# Altium footprint library LION.PcbLib: 90 footprints (part 10 of 13) (continued)
## PL104-4R24-1 [mil] "PL104-4R24-1"
pads (8):
  rect 59.06x59.06 hole 35.43: 1(300,100)
  round 59.06 hole 35.43: 2(300,0) 3(200,100) 4(200,0) 5(100,100) 6(100,0) 7(0,100) 8(0,0)
Top Overlay:
  lines w7.87: 486.22,148.03 530.32,103.94 ; 536.22,-34.25 ccw(c536.46,-16.73) 536.22,0.79 ; 536.22,10.24 ccw(c536.47,27.76) 536.22,45.28 ; 536.22,54.72 ccw(c536.47,72.24) 536.22,89.76 ; 536.22,101.58 ccw(c536.47,119.1) 536.22,136.62 ; -39.37,-50 360.63,-50 532.28,-50 532.28,150 360.63,150 -39.37,150 -39.37,-50
  text "PL104-4R24" at 493.55,69.69 h59.06
  text ".Designator" at -60,75 h25
Mechanical 5:
  lines w7.87: 486.22,148.03 530.32,103.94 ; 536.22,-34.25 ccw(c536.46,-16.73) 536.22,0.79 ; 536.22,10.24 ccw(c536.47,27.76) 536.22,45.28 ; 536.22,54.72 ccw(c536.47,72.24) 536.22,89.76 ; 536.22,101.58 ccw(c536.47,119.1) 536.22,136.62 ; -39.37,-50 -39.37,150 360.63,150 532.28,150 532.28,-50 360.63,-50 -39.37,-50
  text "D6" at -59.99,75 h25
  text "PL104-4R24" at 493.55,69.69 h59.06
Mechanical 14:
  text "8" at 7.2,0 h17.99
  text "2" at 307.2,0 h17.99
  text "4" at 207.2,0 h17.99
  text "6" at 107.2,0 h17.99
  text "1" at 307.2,100 h17.99
  text "3" at 207.2,100 h17.99
  text "5" at 107.2,100 h17.99
  text "7" at 7.2,100 h17.99
Mechanical 16:
  region: -43.31,-53.94 557.93,-53.94 557.93,153.94 -43.31,153.94
Mechanical 17:
  text "PL104-4R24" at 63,-7.87 h15.75
  text "RichardLC" at 56.7,-7.87 h15.75
  text "pn" at 12.6,-7.87 h15.75
3D body: height 150, standoff 0, extent -43.31,-53.94 557.93,153.94

## QFN10P_20_118X118_TP94X65V5 [mil] "QFN10P_20_118X118_TP94X65V5"
pads (16):
  oval 11x39 smd: 1(-39.37,-59.06) 2(-19.69,-59.06) 3(0,-59.06) 4(19.69,-59.06) 5(39.37,-59.06) 6(39.37,59.06) 7(19.69,59.06) 8(0,59.06) 9(-19.69,59.06) 10(-39.37,59.06)
  oct 1x1 smd: 11(0,0)
  round 22 hole 12: 12(-29.53,-19.69) 13(29.53,-19.69) 14(-29.53,19.69) 15(29.53,19.69) 16(0,0)
Top Layer:
  region: 29.53,-78.56 33.87,-78.56 33.87,-39.56 29.53,-39.56
  region: 25.19,-78.56 29.53,-78.56 29.53,-39.56 25.19,-39.56
  region: 9.85,-78.56 14.19,-78.56 14.19,-39.56 9.85,-39.56
  region: 5.5,-78.56 9.84,-78.56 9.84,-39.56 5.5,-39.56
  region: -9.84,-78.56 -5.5,-78.56 -5.5,-39.56 -9.84,-39.56
  region: -14.19,-78.56 -9.85,-78.56 -9.85,-39.56 -14.19,-39.56
  region: -29.53,-78.56 -25.19,-78.56 -25.19,-39.56 -29.53,-39.56
  region: -33.87,-78.56 -29.53,-78.56 -29.53,-39.56 -33.87,-39.56
Top Overlay:
  lines w10: -83,-23 -83,23 -64.06,23 -64.06,64.06 -52.87,64.06 -52.87,86.56 52.87,86.56 52.87,64.06 64.06,64.06 64.06,23 83,23 83,-23 64.06,-23 64.06,-64.06 52.87,-64.06 52.87,-86.56 -52.87,-86.56 -52.87,-64.06 -64.06,-64.06 -64.06,-23 -83,-23 ; -59.37,-111.56 -39.37,-91.56 -19.37,-111.56 -59.37,-111.56
Mechanical 5:
  lines w10: -83,-23 -64.06,-23 -64.06,-64.06 -52.87,-64.06 -52.87,-86.56 52.87,-86.56 52.87,-64.06 64.06,-64.06 64.06,-23 83,-23 83,23 64.06,23 64.06,64.06 52.87,64.06 52.87,86.56 -52.87,86.56 -52.87,64.06 -64.06,64.06 -64.06,23 -83,23 -83,-23 ; -59.37,-111.56 -19.37,-111.56 -39.37,-91.56 -59.37,-111.56
  text "U97" at 48.47,-100.62 h25
Mechanical 13:
  lines w1: -605.5,-435 -624.5,-435 -624.5,-385 -605.5,-385 ; -560,-245 -579,-245 -579,-195 -560,-195 ; -280,-245 -261,-245 -261,-195 -280,-195 ; -274.5,-435 -255.5,-435 -255.5,-385 -274.5,-385 ; -223.5,-170 -19.69,-170 ; -218,-360 -59.06,-360 ; -59.06,-458.43 -59.06,-157.48 ; -19.69,-268.43 -19.69,-157.48 ; 0,-268.43 0,-157.48 ; 59.06,-458.43 59.06,-157.48 ; 134.5,-555 115.5,-555 115.5,-505 134.5,-505 ; 157.48,-59.06 398.43,-59.06 ; 157.48,59.06 398.43,59.06 ; 300,-367.5 300,-59.06 ; 300,374.02 300,59.06 ; 314.96,-170 0,-170 ; 374.02,-360 59.06,-360 ; 465.5,-555 484.5,-555 484.5,-505 465.5,-505 ; -59.06,-360 -216.54,-384.61 -216.54,-335.39 -59.06,-360 ; -19.69,-170 -177.17,-194.61 -177.17,-145.39 -19.69,-170 ; 0,-170 157.48,-145.39 157.48,-194.61 0,-170 ; 59.06,-360 216.54,-335.39 216.54,-384.61 59.06,-360 ; 300,-59.06 324.61,-216.54 275.39,-216.54 300,-59.06 ; 300,59.06 275.39,216.54 324.61,216.54 300,59.06
  text "118.11" at 153.5,-555 h36
  text "3" at 281,-455 h36
  text "118.11" at -586.5,-435 h36
  text "3" at -459,-335 h36
  text "19.69" at -541,-245 h36
  text "0.5" at -490,-145 h36
Mechanical 14:
  text "1" at -28.17,-59.06 h28
  text "7" at 30.89,59.06 h28
  text "9" at -8.49,59.06 h28
  text "2" at -8.49,-59.06 h28
  text "3" at 11.2,-59.06 h28
  text "5" at 50.57,-59.06 h28
  text "6" at 50.57,59.06 h28
  text "10" at -16.97,59.06 h28
  text "4" at 30.89,-59.06 h28
  text "8" at 11.2,59.06 h28
  text "13" at 51.93,-19.69 h28
  text "14" at -7.13,19.69 h28
  text "16" at 22.4,0 h28
  text "15" at 51.93,19.69 h28
  text "12" at -7.13,-19.69 h28
  text "11" at 22.4,0 h28
Mechanical 16:
  pour cut-out: 52.87,86.56 52.87,64.06 64.06,64.06 64.06,23 83,23 83,-23 64.06,-23 64.06,-64.06 52.87,-64.06 52.87,-86.56 -52.87,-86.56 -52.87,-64.06 -64.06,-64.06 -64.06,-23 -83,-23 -83,23 -64.06,23 -64.06,64.06 -52.87,64.06 -52.87,86.56
  region: -59.06,-59.06 59.06,-59.06 59.06,59.06 -59.06,59.06
  lines w1: -59.06,-59.06 -59.06,59.06 59.06,59.06 59.06,-59.06 -59.06,-59.06
Mechanical 17:
  text ".Designator" at 6,1.67 h5
3D body: height 150, standoff 0, extent -59.06,-59.06 59.06,59.06

## QFN16 [mil] "QFN16"
pads (17):
  rect 44x12 smd: 1(-97,47.24) 2(-97,15.75) 3(-97,-15.75) 4(-97,-47.24) 9(97,-47.24) 10(97,-15.75) 11(97,15.75) 12(97,47.24)
  rect 12x44 smd: 5(-47.24,-97) 6(-15.75,-97) 7(15.75,-97) 8(47.24,-97) 13(47.24,97) 14(15.75,97) 15(-15.75,97) 16(-47.24,97)
  rect 130x130 smd: 17(0,0)
Top Layer:
  region: -50,119.5 51,119.5 55,115.5 57,109.5 57,85.5 55,78.5 49,74.5 -51,74.5 -55,78.5 -58,86.5 -58,108.5 -55,115.5
  region: -50,-74.5 51,-74.5 55,-78.5 57,-84.5 57,-108.5 55,-115.5 49,-119.5 -51,-119.5 -55,-115.5 -58,-107.5 -58,-85.5 -55,-78.5
  region: 119.5,50 119.5,-51 115.5,-55 109.5,-57 85.5,-57 78.5,-55 74.5,-49 74.5,51 78.5,55 86.5,58 108.5,58 115.5,55
  region: -74.5,50 -74.5,-51 -78.5,-55 -84.5,-57 -108.5,-57 -115.5,-55 -119.5,-49 -119.5,51 -115.5,55 -107.5,58 -85.5,58 -78.5,55
Top Overlay:
  circle w10: c-115,85 r5
  lines w5: -105,-60 -105,-75 -75,-105 -60,-105 ; -105,60 -105,70 -70,105 -60,105 ; 60,-105 75,-105 105,-75 105,-60 ; 60,105 70,105 105,70 105,60
Mechanical 5:
  circle w10: c-115,85 r5
  lines w5: -105,-60 -105,-75 -75,-105 -60,-105 ; -105,60 -105,70 -70,105 -60,105 ; 60,-105 75,-105 105,-75 105,-60 ; 60,105 70,105 105,70 105,60
  text "MAX8556_1_QFN16_MAX8556ETE+" at 291,-81.67 h20
  text "U78" at 210.68,-32.7 h25
Mechanical 14:
  text "16" at 16.76,97 h80
  text "8" at 79.24,-97 h80
  text "7" at 47.75,-97 h80
  text "9" at 129,-47.24 h80
  text "10" at 161,-15.75 h80
  text "11" at 161,15.75 h80
  text "13" at 111.24,97 h80
  text "12" at 161,47.24 h80
  text "6" at 16.25,-97 h80
  text "5" at -15.24,-97 h80
  text "4" at -65,-47.24 h80
  text "3" at -65,-15.75 h80
  text "2" at -65,15.75 h80
  text "1" at -65,47.24 h80
  text "14" at 79.75,97 h80
  text "15" at 48.25,97 h80
  text "17" at 64,0 h80
Mechanical 16:
  region: 98.43,-74.58 75,-98 74.58,-98.43 -75.58,-98.43 -76,-98 -98.43,-75.58 -98.43,68.58 -98,69 -68.58,98.43 69.58,98.43 70,98 98.43,69.58
  lines w1: -131,-70 -71.49,-129.48 -71,-130 75,-130 130,-75 130,70 69,131 -65,131 -75,131 -131,75 -131,-70
Mechanical 17:
  text ".Designator" at 6,-1.67 h5
  text "MAX8556ETE+" at 13,-100 h20
3D body: height 150, standoff 0, extent -98.43,-98.43 98.43,98.43

## QFN16_4X4_PAD2_1X2_1 [mil] "QFN16_4X4_PAD2_1X2_1"
pads (17):
  oval 14x41 smd: 1(-38.39,-74.8) 2(-12.8,-74.8) 3(12.8,-74.8) 4(38.39,-74.8) 9(38.39,74.8) 10(12.8,74.8) 11(-12.8,74.8) 12(-38.39,74.8)
  oval 41x14 smd: 5(74.8,-38.39) 6(74.8,-12.8) 7(74.8,12.8) 8(74.8,38.39) 13(-74.8,38.39) 14(-74.8,12.8) 15(-74.8,-12.8) 16(-74.8,-38.39)
  rect 83x83 smd: PAD(0,0)
Top Overlay:
  pour cut-out: -83.86,-83.14 -89.71,-84.3 -94.67,-87.62 -97.99,-92.58 -99.15,-98.43 -97.99,-104.28 -94.67,-109.24 -89.71,-112.56 -83.86,-113.72 -78.01,-112.56 -73.05,-109.24 -69.73,-104.28 -68.57,-98.43 -69.73,-92.58 -73.05,-87.62 -78.01,-84.3
  lines w1: -88.74,-60.39 -88.74,-61.18 -61.18,-88.74 -60.39,-88.74 ; -88.74,60.39 -88.74,61.18 -61.18,88.74 -60.39,88.74 ; 60.39,-88.74 61.18,-88.74 88.74,-61.18 88.74,-60.39 ; 60.39,88.74 61.18,88.74 88.74,61.18 88.74,60.39
  text ".Designator" at -117.5,-35.99 h25
Mechanical 5:
  lines w1: -88.74,-60.39 -88.74,-61.18 -61.18,-88.74 -60.39,-88.74 ; -88.74,60.39 -88.74,61.18 -61.18,88.74 -60.39,88.74 ; 60.39,-88.74 61.18,-88.74 88.74,-61.18 88.74,-60.39 ; 60.39,88.74 61.18,88.74 88.74,61.18 88.74,60.39
  text "U132" at -117.5,-35.99 h25
Mechanical 14:
  text "8" at 74.8,18.39 h25
  text "5" at 74.8,-58.39 h25
  text "7" at 74.8,-7.2 h25
  text "9" at 38.39,54.8 h25
  text "4" at 38.39,-94.8 h25
  text "3" at 12.8,-94.8 h25
  text "2" at -12.8,-94.8 h25
  text "1" at -38.39,-94.8 h25
  text "16" at -74.8,-58.39 h25
  text "15" at -74.8,-32.8 h25
  text "12" at -38.39,34.8 h25
  text "11" at -12.8,34.8 h25
  text "10" at 12.8,34.8 h25
  text "14" at -74.8,-7.2 h25
  text "13" at -74.8,18.39 h25
  text "6" at 74.8,-32.8 h25
  text "PAD" at 0,-60 h25
Mechanical 16:
  pour cut-out: -105.3,-105.3 105.3,-105.3 105.3,105.3 -105.3,105.3
  pour cut-out: -39.37,-43.77 -45.22,-44.93 -50.18,-48.25 -53.5,-53.21 -54.66,-59.06 -53.5,-64.91 -50.18,-69.87 -45.22,-73.19 -39.37,-74.35 -33.52,-73.19 -28.56,-69.87 -25.24,-64.91 -24.08,-59.06 -25.24,-53.21 -28.56,-48.25 -33.52,-44.93
  region: -110.3,110.3 -110.3,-110.3 110.3,-110.3 110.3,110.3
  lines w1: -105.3,-105.3 -105.3,105.3 105.3,105.3 105.3,-105.3 -105.3,-105.3 ; -78.74,-55.12 -55.12,-78.74 55.12,-78.74 78.74,-55.12 78.74,55.12 55.12,78.74 -55.12,78.74 -78.74,55.12 -78.74,-55.12
Mechanical 17:
  text "ADP1741ACPZ-R7" at -11.35,-140 h25
  text "TOL" at 28.02,-30 h25
  text "UPN" at 67.39,-30 h25
Mechanical 31:
  text "REPLACE OB14X41_SM2X2.PAD WITH OB14X41_SM2X2_BUMP.PAD" at 0,-892.67 h25
  text "REPLACE 83X83_SM2X2.PAD WITH 83X83_SM2X2_BUMP.PAD" at 0,-892.04 h25
  text "TO CONVERT THIS NON-BUMPED FOOTPRINT SYMBOL TO A BUMPED VERSION;" at 0,-963.3 h25
  text "THE SIZE OF THE VIA BUMPS,QUANTITY AND THE LOCATION ON THE PADDLE PAD" at 0,-1131.41 h25
  text "IS TO BE DETERMINED BY THE RESPONSIBLE ENGINEER AND THE LAYOUT PERSON." at 0,-1180.78 h25
3D body: height 150, standoff 0, extent -110.3,-110.3 110.3,110.3

## QFN16_050 [mil] "QFN16_050"
pads (17):
  oval 40x12 smd: 1(-59.06,29.53) 2(-59.06,9.84) 3(-59.06,-9.84) 4(-59.06,-29.53) 9(59.06,-29.53) 10(59.06,-9.84) 11(59.06,9.84) 12(59.06,29.53)
  oval 12x40 smd: 5(-29.53,-59.06) 6(-9.84,-59.06) 7(9.84,-59.06) 8(29.53,-59.06) 13(29.53,59.06) 14(9.84,59.06) 15(-9.84,59.06) 16(-29.53,59.06)
  rect 60x60 smd: 17(0,0)
Top Overlay:
  lines w5.12: -59.06,-39.37 -59.06,-59.06 -39.37,-59.06 ; -59.06,39.37 -59.06,49.21 -49.21,59.06 -39.37,59.06 ; 39.37,-59.06 59.06,-59.06 59.06,-39.37 ; 39.37,59.06 59.06,59.06 59.06,39.37 ; -78.74,59.06 cw(c-68.9,59.06) -68.9,68.9 cw(c-68.9,59.06) -59.06,59.06 cw(c-68.9,59.05) -68.9,49.21 cw(c-68.9,59.05) -78.74,59.06
Mechanical 5:
  lines w5.12: -59.06,-39.37 -59.06,-59.06 -39.37,-59.06 ; -59.06,39.37 -59.06,49.21 -49.21,59.06 -39.37,59.06 ; 39.37,-59.06 59.06,-59.06 59.06,-39.37 ; 39.37,59.06 59.06,59.06 59.06,39.37 ; -78.74,59.06 ccw(c-68.9,59.05) -68.9,49.21 ccw(c-68.9,59.05) -59.06,59.06 ccw(c-68.9,59.06) -68.9,68.9 ccw(c-68.9,59.06) -78.74,59.06
  text "U120" at 58.72,-102.55 h25
Mechanical 14:
  text "15" at 6.16,59.06 h10
  text "5" at -21.53,-59.06 h10
  text "3" at -51.06,-9.84 h10
  text "1" at -51.06,29.53 h10
  text "2" at -51.06,9.84 h10
  text "11" at 75.06,9.84 h10
  text "4" at -51.06,-29.53 h10
  text "8" at 37.53,-59.06 h10
  text "7" at 17.84,-59.06 h10
  text "6" at -1.84,-59.06 h10
  text "17" at 56,0 h35
  text "9" at 87.06,-29.53 h35
  text "14" at 25.84,59.06 h10
  text "12" at 75.06,29.53 h10
  text "13" at 45.53,59.06 h10
  text "16" at -13.53,59.06 h10
  text "10" at 75.06,-9.84 h10
Mechanical 16:
  region: -81.3,-79.06 79.06,-79.06 79.06,79.06 -81.3,79.06
  lines w5.12: -59.06,-39.37 -59.06,-59.06 -39.37,-59.06 ; -59.06,39.37 -59.06,49.21 -49.21,59.06 -39.37,59.06 ; 39.37,-59.06 59.06,-59.06 59.06,-39.37 ; 39.37,59.06 59.06,59.06 59.06,39.37 ; -78.74,59.06 ccw(c-68.9,59.05) -68.9,49.21 ccw(c-68.9,59.05) -59.06,59.06 ccw(c-68.9,59.06) -68.9,68.9 ccw(c-68.9,59.06) -78.74,59.06
3D body: height 150, standoff 0, extent -81.3,-79.06 79.06,79.06

## QFN16_MAX8556 [mil] "QFN16_MAX8556"
pads (17):
  rect 44x12 smd: 1(-97,47.2) 2(-97,15.7) 3(-97,-15.7) 4(-97,-47.2) 9(97,-47.2) 10(97,-15.7) 11(97,15.7) 12(97,47.2)
  rect 12x44 smd: 5(-47.2,-97) 6(-15.7,-97) 7(15.7,-97) 8(47.2,-97) 13(47.2,97) 14(15.7,97) 15(-15.7,97) 16(-47.2,97)
  rect 130x130 smd: 17(0,0)
Top Layer:
  region: -74.5,50 -74.5,-51 -78.5,-55 -84.5,-57 -108.5,-57 -115.5,-55 -119.5,-49 -119.5,51 -115.5,55 -107.5,58 -85.5,58 -78.5,55
  region: 119.5,50 119.5,-51 115.5,-55 109.5,-57 85.5,-57 78.5,-55 74.5,-49 74.5,51 78.5,55 86.5,58 108.5,58 115.5,55
  region: -50,-74.5 51,-74.5 55,-78.5 57,-84.5 57,-108.5 55,-115.5 49,-119.5 -51,-119.5 -55,-115.5 -58,-107.5 -58,-85.5 -55,-78.5
  region: -50,119.5 51,119.5 55,115.5 57,109.5 57,85.5 55,78.5 49,74.5 -51,74.5 -55,78.5 -58,86.5 -58,108.5 -55,115.5
Top Overlay:
  circle w10: c-115,85 r5
  lines w5: -105,-60 -105,-75 -75,-105 -60,-105 ; -105,60 -105,70 -70,105 -60,105 ; 60,-105 75,-105 105,-75 105,-60 ; 60,105 70,105 105,70 105,60
  text ".Designator" at -137.5,-22.5 h25
Mechanical 5:
  circle w10: c-115,85 r5
  lines w5: -105,-60 -105,-75 -75,-105 -60,-105 ; -105,60 -105,70 -70,105 -60,105 ; 60,-105 75,-105 105,-75 105,-60 ; 60,105 70,105 105,70 105,60
  text "U22" at -180.83,4.16 h25
  text "MAX8556_0_QFN16_MAX8556_MAX8556" at 75,-1073.7 h80
Mechanical 14:
  text "6" at -15.7,-111 h35
  text "5" at -47.2,-111 h35
  text "16" at -47.2,69 h35
  text "4" at -97,-61.2 h35
  text "3" at -97,-29.7 h35
  text "2" at -97,1.7 h35
  text "1" at -97,33.2 h35
  text "11" at 97,-12.3 h35
  text "10" at 97,-43.7 h35
  text "9" at 97,-61.2 h35
  text "7" at 15.7,-111 h35
  text "8" at 47.2,-111 h35
  text "12" at 97,19.2 h35
  text "13" at 47.2,69 h35
  text "14" at 15.7,69 h35
  text "15" at -15.7,69 h35
  text "17" at 0,-28 h35
Mechanical 16:
  region: 98.4,-74.6 74.6,-98.4 -75.6,-98.4 -98.4,-75.6 -98.4,68.6 -68.6,98.4 69.6,98.4 98.4,69.6
  lines w1: -131,-70 -71.5,-129.5 -71,-130 75,-130 130,-75 130,70 69,131 -65,131 -75,131 -131,75 -131,-70
Mechanical 17:
  text "MAX8556ETE+" at -75,-188 h20
3D body: height 150, standoff 0, extent -98.4,-98.4 98.4,98.4

## QFN48_7X7 [mil] "QFN48_7X7"
pads (49):
  oct 1x1 smd: 1(-135.83,108.27) 2(-135.83,88.58) 3(-135.83,68.9) 4(-135.83,49.21) 5(-135.83,29.53) 6(-135.83,9.84) 7(-135.83,-9.84) 8(-135.83,-29.53) 9(-135.83,-49.21) 10(-135.83,-68.9) 11(-135.83,-88.58) 12(-135.83,-108.27) 13(-108.27,-135.83) 14(-88.58,-135.83) 15(-68.9,-135.83) 16(-49.21,-135.83) 17(-29.53,-135.83) 18(-9.84,-135.83) 19(9.84,-135.83) 20(29.53,-135.83) 21(49.21,-135.83) 22(68.9,-135.83) 23(88.58,-135.83) 24(108.27,-135.83) 25(135.83,-108.27) 26(135.83,-88.58) 27(135.83,-68.9) 28(135.83,-49.21) 29(135.83,-29.53) 30(135.83,-9.84) 31(135.83,9.84) 32(135.83,29.53) 33(135.83,49.21) 34(135.83,68.9) 35(135.83,88.58) 36(135.83,108.27) 37(108.27,135.83) 38(88.58,135.83) 39(68.9,135.83) 40(49.21,135.83) 41(29.53,135.83) 42(9.84,135.83) 43(-9.84,135.83) 44(-29.53,135.83) 45(-49.21,135.83) 46(-68.9,135.83) 47(-88.58,135.83) 48(-108.27,135.83)
  rect 220.47x220.47 smd: 49(0,0)
Top Overlay:
  circle w9.84: c-175.2,108.27 r4.92
  lines w7.87: -139.76,-127.95 -139.76,-139.76 -127.95,-139.76 ; -139.76,127.95 -139.76,130.31 -130.31,139.76 -127.95,139.76 ; 127.95,-139.76 139.76,-139.76 139.76,-127.95 ; 127.95,139.76 139.76,139.76 139.76,127.95
  text ".Designator" at -3.83,170.05 h25
Top Paste:
  pour cut-out: -83.46,-83.46 -83.46,-13.39 -13.39,-13.39 -13.39,-83.46
  pour cut-out: 13.39,-83.46 13.39,-13.39 83.46,-13.39 83.46,-83.46
  pour cut-out: -83.46,13.39 -83.46,83.46 -13.39,83.46 -13.39,13.39
  pour cut-out: 13.39,13.39 13.39,83.46 83.46,83.46 83.46,13.39
Mechanical 5:
  circle w9.84: c-175.2,108.27 r4.92
  lines w7.87: -139.76,-127.95 -139.76,-139.76 -127.95,-139.76 ; -139.76,127.95 -139.76,130.31 -130.31,139.76 -127.95,139.76 ; 127.95,-139.76 139.76,-139.76 139.76,-127.95 ; 127.95,139.76 139.76,139.76 139.76,127.95
  text "HMC7043LP7FE_0_QFN48_7X7_HMC704" at -620,29.53 h50
  text "U119" at 66.16,170.05 h25
Mechanical 14:
  text "2" at -145.83,88.58 h25
  text "1" at -145.83,108.27 h25
  text "3" at -145.83,68.9 h25
  text "48" at -128.27,135.83 h25
  text "39" at 48.9,135.83 h25
  text "30" at 115.83,-9.84 h25
  text "27" at 115.83,-68.9 h25
  text "13" at -128.27,-135.83 h25
  text "19" at -10.16,-135.83 h25
  text "8" at -145.83,-29.53 h25
  text "33" at 115.83,49.21 h25
  text "12" at -155.83,-108.27 h25
  text "17" at -49.53,-135.83 h25
  text "4" at -145.83,49.21 h25
  text "16" at -69.21,-135.83 h25
  text "11" at -155.83,-88.58 h25
  text "36" at 115.83,108.27 h25
  text "18" at -29.84,-135.83 h25
  text "37" at 88.27,135.83 h25
  text "40" at 29.21,135.83 h25
  text "41" at 9.53,135.83 h25
  text "9" at -145.83,-49.21 h25
  text "43" at -29.84,135.83 h25
  text "38" at 68.58,135.83 h25
  text "22" at 48.9,-135.83 h25
  text "35" at 115.83,88.58 h25
  text "23" at 68.58,-135.83 h25
  text "42" at -10.16,135.83 h25
  text "15" at -88.9,-135.83 h25
  text "10" at -155.83,-68.9 h25
  text "45" at -69.21,135.83 h25
  text "44" at -49.53,135.83 h25
  text "47" at -108.58,135.83 h25
  text "46" at -88.9,135.83 h25
  text "20" at 9.53,-135.83 h25
  text "21" at 29.21,-135.83 h25
  text "31" at 115.83,9.84 h25
  text "32" at 115.83,29.53 h25
  text "34" at 115.83,68.9 h25
  text "5" at -145.83,29.53 h25
  text "29" at 115.83,-29.53 h25
  text "28" at 115.83,-49.21 h25
  text "25" at 115.83,-108.27 h25
  text "26" at 115.83,-88.58 h25
  text "7" at -145.83,-9.84 h25
  text "6" at -145.83,9.84 h25
  text "49" at -20,0 h25
  text "24" at 88.27,-135.83 h25
  text "14" at -108.58,-135.83 h25
Mechanical 16:
  circle w3.94: c-99.41,99.41 r19.69
  circle w1.97: c0,0 r13.78
  pour cut-out: -163.39,-163.39 -163.39,163.39 163.39,163.39 163.39,-163.39
  region: -163.39,-163.39 -163.39,163.39 163.39,163.39 163.39,-163.39
  lines w1.97: -19.69,0 19.69,0 ; 0,-19.69 0,19.69
  lines w3.94: -138.78,-138.78 -138.78,138.78 138.78,138.78 138.78,-138.78 -138.78,-138.78
3D body: height 150, standoff 0, extent -163.39,-163.39 163.39,163.39

## QFN64_9X9MM_B [mil] "QFN64_9X9MM_B"
pads (65):
  oval 40x12 smd: 1(-180.3,147.75) 2(-180.3,128.05) 3(-180.3,108.35) 4(-180.3,88.65) 5(-180.3,68.95) 6(-180.3,49.25) 7(-180.3,29.55) 8(-180.3,9.85) 9(-180.3,-9.85) 10(-180.3,-29.55) 11(-180.3,-49.25) 12(-180.3,-68.95) 13(-180.3,-88.65) 14(-180.3,-108.35) 15(-180.3,-128.05) 16(-180.3,-147.75) 33(180.3,-147.75) 34(180.3,-128.05) 35(180.3,-108.35) 36(180.3,-88.65) 37(180.3,-68.95) 38(180.3,-49.25) 39(180.3,-29.55) 40(180.3,-9.85) 41(180.3,9.85) 42(180.3,29.55) 43(180.3,49.25) 44(180.3,68.95) 45(180.3,88.65) 46(180.3,108.35) 47(180.3,128.05) 48(180.3,147.75)
  oval 12x40 smd: 17(-147.75,-180.3) 18(-128.05,-180.3) 19(-108.35,-180.3) 20(-88.65,-180.3) 21(-68.95,-180.3) 22(-49.25,-180.3) 23(-29.55,-180.3) 24(-9.85,-180.3) 25(9.85,-180.3) 26(29.55,-180.3) 27(49.25,-180.3) 28(68.95,-180.3) 29(88.65,-180.3) 30(108.35,-180.3) 31(128.05,-180.3) 32(147.75,-180.3) 49(147.75,180.3) 50(128.05,180.3) 51(108.35,180.3) 52(88.65,180.3) 53(68.95,180.3) 54(49.25,180.3) 55(29.55,180.3) 56(9.85,180.3) 57(-9.85,180.3) 58(-29.55,180.3) 59(-49.25,180.3) 60(-68.95,180.3) 61(-88.65,180.3) 62(-108.35,180.3) 63(-128.05,180.3) 64(-147.75,180.3)
  rect 290x290 smd: 65(0,0)
via -120,-40 diameter 18 hole 10
via -120,120 diameter 18 hole 10
via -120,40 diameter 18 hole 10
via -120,80 diameter 18 hole 10
via -120,0 diameter 18 hole 10
via 40,120 diameter 18 hole 10
via 40,-40 diameter 18 hole 10
via -40,40 diameter 18 hole 10
via 40,40 diameter 18 hole 10
via -40,-40 diameter 18 hole 10
via -40,120 diameter 18 hole 10
via -40,80 diameter 18 hole 10
via 40,80 diameter 18 hole 10
via 40,0 diameter 18 hole 10
via -40,0 diameter 18 hole 10
via -80,0 diameter 18 hole 10
via -80,40 diameter 18 hole 10
via -80,80 diameter 18 hole 10
via -80,120 diameter 18 hole 10
via 0,120 diameter 18 hole 10
via 0,80 diameter 18 hole 10
via 0,40 diameter 18 hole 10
via 0,0 diameter 18 hole 10
via 0,-40 diameter 18 hole 10
via -80,-40 diameter 18 hole 10
via -120,-80 diameter 18 hole 10
via -80,-80 diameter 18 hole 10
via -40,-80 diameter 18 hole 10
via 0,-80 diameter 18 hole 10
via 40,-80 diameter 18 hole 10
via 120,-80 diameter 18 hole 10
via 120,-40 diameter 18 hole 10
via 120,0 diameter 18 hole 10
via 120,40 diameter 18 hole 10
via 120,80 diameter 18 hole 10
via 120,120 diameter 18 hole 10
via -120,-120 diameter 18 hole 10
via -80,-120 diameter 18 hole 10
via -40,-120 diameter 18 hole 10
via 0,-120 diameter 18 hole 10
via 40,-120 diameter 18 hole 10
via 80,-120 diameter 18 hole 10
via 80,-80 diameter 18 hole 10
via 80,-40 diameter 18 hole 10
via 80,0 diameter 18 hole 10
via 80,40 diameter 18 hole 10
via 80,80 diameter 18 hole 10
via 80,120 diameter 18 hole 10
via 120,-120 diameter 18 hole 10
Top Overlay:
  lines w7: -190,-165 -190,-190 -165,-190 ; -190,165 -165,190 ; 165,-190 190,-190 190,-165 ; 165,190 190,190 190,165
  lines w10: -230,150 ccw(c-220,150) -220,140 ccw(c-220,150) -210,150 ccw(c-220,150) -220,160 ccw(c-220,150) -230,150
Top Paste:
  pour cut-out: -75,-135 -135,-135 -135,-75 -75,-75
  pour cut-out: -75,-65 -135,-65 -135,-5 -75,-5
  pour cut-out: -75,5 -135,5 -135,65 -75,65
  pour cut-out: -75,75 -135,75 -135,135 -75,135
  pour cut-out: -5,-135 -65,-135 -65,-75 -5,-75
  pour cut-out: -5,-65 -65,-65 -65,-5 -5,-5
  pour cut-out: -5,5 -65,5 -65,65 -5,65
  pour cut-out: -5,75 -65,75 -65,135 -5,135
  pour cut-out: 65,75 5,75 5,135 65,135
  pour cut-out: 135,75 75,75 75,135 135,135
  pour cut-out: 65,5 5,5 5,65 65,65
  pour cut-out: 135,5 75,5 75,65 135,65
  pour cut-out: 135,-65 75,-65 75,-5 135,-5
  pour cut-out: 65,-65 5,-65 5,-5 65,-5
  pour cut-out: 65,-135 5,-135 5,-75 65,-75
  pour cut-out: 135,-135 75,-135 75,-75 135,-75
Mechanical 5:
  lines w7: -190,-165 -190,-190 -165,-190 ; -190,165 -165,190 ; 165,-190 190,-190 190,-165 ; 165,190 190,190 190,165
  lines w10: -230,150 cw(c-220,150) -220,160 cw(c-220,150) -210,150 cw(c-220,150) -220,140 cw(c-220,150) -230,150
  text "U74" at 30,230 h25
Mechanical 14:
  text "10" at -124.3,-29.55 h35
  text "2" at -152.3,128.05 h35
  text "45" at 236.3,88.65 h35
  text "11" at -124.3,-49.25 h35
  text "44" at 236.3,68.95 h35
  text "58" at 26.45,180.3 h35
  text "13" at -124.3,-88.65 h35
  text "63" at -72.05,180.3 h35
  text "38" at 236.3,-49.25 h35
  text "37" at 236.3,-68.95 h35
  text "5" at -152.3,68.95 h35
  text "12" at -124.3,-68.95 h35
  text "30" at 164.35,-180.3 h35
  text "8" at -152.3,9.85 h35
  text "27" at 105.25,-180.3 h35
  text "20" at -32.65,-180.3 h35
  text "64" at -91.75,180.3 h35
  text "23" at 26.45,-180.3 h35
  text "31" at 184.05,-180.3 h35
  text "32" at 203.75,-180.3 h35
  text "60" at -12.95,180.3 h35
  text "46" at 236.3,108.35 h35
  text "28" at 124.95,-180.3 h35
  text "17" at -91.75,-180.3 h35
  text "61" at -32.65,180.3 h35
  text "7" at -152.3,29.55 h35
  text "9" at -152.3,-9.85 h35
  text "21" at -12.95,-180.3 h35
  text "24" at 46.15,-180.3 h35
  text "29" at 144.65,-180.3 h35
  text "26" at 85.55,-180.3 h35
  text "22" at 6.75,-180.3 h35
  text "56" at 65.85,180.3 h35
  text "55" at 85.55,180.3 h35
  text "3" at -152.3,108.35 h35
  text "47" at 236.3,128.05 h35
  text "54" at 105.25,180.3 h35
  text "1" at -152.3,147.75 h35
  text "53" at 124.95,180.3 h35
  text "4" at -152.3,88.65 h35
  text "51" at 164.35,180.3 h35
  text "50" at 184.05,180.3 h35
  text "42" at 236.3,29.55 h35
  text "41" at 236.3,9.85 h35
  text "16" at -124.3,-147.75 h35
  text "39" at 236.3,-29.55 h35
  text "18" at -72.05,-180.3 h35
  text "62" at -52.35,180.3 h35
  text "6" at -152.3,49.25 h35
  text "35" at 236.3,-108.35 h35
  text "34" at 236.3,-128.05 h35
  text "59" at 6.75,180.3 h35
  text "19" at -52.35,-180.3 h35
  text "49" at 203.75,180.3 h35
  text "52" at 144.65,180.3 h35
  text "57" at 46.15,180.3 h35
  text "33" at 236.3,-147.75 h35
  text "40" at 236.3,-9.85 h35
  text "36" at 236.3,-88.65 h35
  text "43" at 236.3,49.25 h35
  text "65" at 40,0 h25
  text "15" at -124.3,-128.05 h35
  text "14" at -124.3,-108.35 h35
  text "48" at 236.3,147.75 h35
  text "25" at 65.85,-180.3 h35
Mechanical 16:
  region: 205,-205 205,205 -205,205 -205,-205
  lines w1: -180,-180 -180,160 -160,180 180,180 180,-180 -180,-180
Mechanical 17:
  text ".Designator" at 60,-21.67 h50
3D body: height 150, standoff 0, extent -205,-205 205,205

## QFN65P500X500X80HGF-21N [mil] "QFN65P500X500X80HGF-21N"
pads (21):
  oct 1x1 smd: 1(-92.52,51.18) 2(-92.52,25.59) 3(-92.52,0) 4(-92.52,-25.59) 5(-92.52,-51.18) 6(-51.18,-92.52) 7(-25.59,-92.52) 8(0,-92.52) 9(25.59,-92.52) 10(51.18,-92.52) 11(92.52,-51.18) 12(92.52,-25.59) 13(92.52,0) 14(92.52,25.59) 15(92.52,51.18) 16(51.18,92.52) 17(25.59,92.52) 18(0,92.52) 19(-25.59,92.52) 20(-51.18,92.52) 21(0,0)
Top Overlay:
  circle w9.84: c-135.83,51.18 r4.92
  lines w7.87: -98.43,-72.83 -98.43,-98.43 -72.83,-98.43 ; -98.43,72.83 -98.43,77.95 -77.95,98.43 -72.83,98.43 ; 72.83,-98.43 98.43,-98.43 98.43,-72.83 ; 72.83,98.43 98.43,98.43 98.43,72.83
  text ".Designator" at 124.17,94.05 h25
Top Paste:
  pour cut-out: -39.84,39.84 39.85,39.84 39.85,-39.85 -39.84,-39.85
Mechanical 5:
  circle w9.84: c-135.83,51.18 r4.92
  lines w7.87: -98.43,-72.83 -98.43,-98.43 -72.83,-98.43 ; -98.43,72.83 -98.43,77.95 -77.95,98.43 -72.83,98.43 ; 72.83,-98.43 98.43,-98.43 98.43,-72.83 ; 72.83,98.43 98.43,98.43 98.43,72.83
  text "TPS7A4700_2_QFN65P500X500X80HGF" at -310,29.53 h25
  text "U129" at 124.16,94.05 h25
Mechanical 14:
  text "12" at 72.52,-25.59 h25
  text "11" at 72.52,-51.18 h25
  text "9" at 15.59,-92.52 h25
  text "8" at -10,-92.52 h25
  text "6" at -61.18,-92.52 h25
  text "5" at -102.52,-51.18 h25
  text "4" at -102.52,-25.59 h25
  text "2" at -102.52,25.59 h25
  text "17" at 5.59,92.52 h25
  text "18" at -20,92.52 h25
  text "19" at -45.59,92.52 h25
  text "1" at -102.52,51.18 h25
  text "3" at -102.52,0 h25
  text "20" at -71.18,92.52 h25
  text "14" at 72.52,25.59 h25
  text "10" at 31.18,-92.52 h25
  text "13" at 72.52,0 h25
  text "15" at 72.52,51.18 h25
  text "16" at 31.18,92.52 h25
  text "21" at -20,0 h25
  text "7" at -35.59,-92.52 h25
Mechanical 16:
  circle w1.97: c0,0 r13.78
  pour cut-out: -122.05,-122.05 -122.05,122.05 122.05,122.05 122.05,-122.05
  region: -122.05,-122.05 -122.05,122.05 122.05,122.05 122.05,-122.05
  lines w1.97: -19.69,0 19.69,0 ; 0,-19.69 0,19.69
  lines w3.94: -98.43,59.06 -59.06,98.43 ; -98.43,62.99 -62.99,98.43 ; -98.43,66.93 -66.93,98.43 ; -98.43,70.87 -70.87,98.43 ; -98.43,74.8 -74.8,98.43 ; -98.43,78.74 -78.74,98.43 ; -98.43,82.68 -82.68,98.43 ; -98.43,86.61 -86.61,98.43 ; -98.43,90.55 -90.55,98.43 ; -98.43,94.49 -94.49,98.43 ; -98.43,-98.43 -98.43,98.43 98.43,98.43 98.43,-98.43 -98.43,-98.43
3D body: height 150, standoff 0, extent -122.05,-122.05 122.05,122.05